# Altium footprint library My_Intlib.PcbLib: 224 footprints (part 14 of 14)
Each footprint in its own frame and in the unit in brackets; x right, y up, seen from the top. Pads: shape width x height; smd on the part's side, far side on the other; paste and mask are expansions set on the pad; w line width, h text height; cw(c..) or ccw(c..) is an arc to the next point about the centre after c.
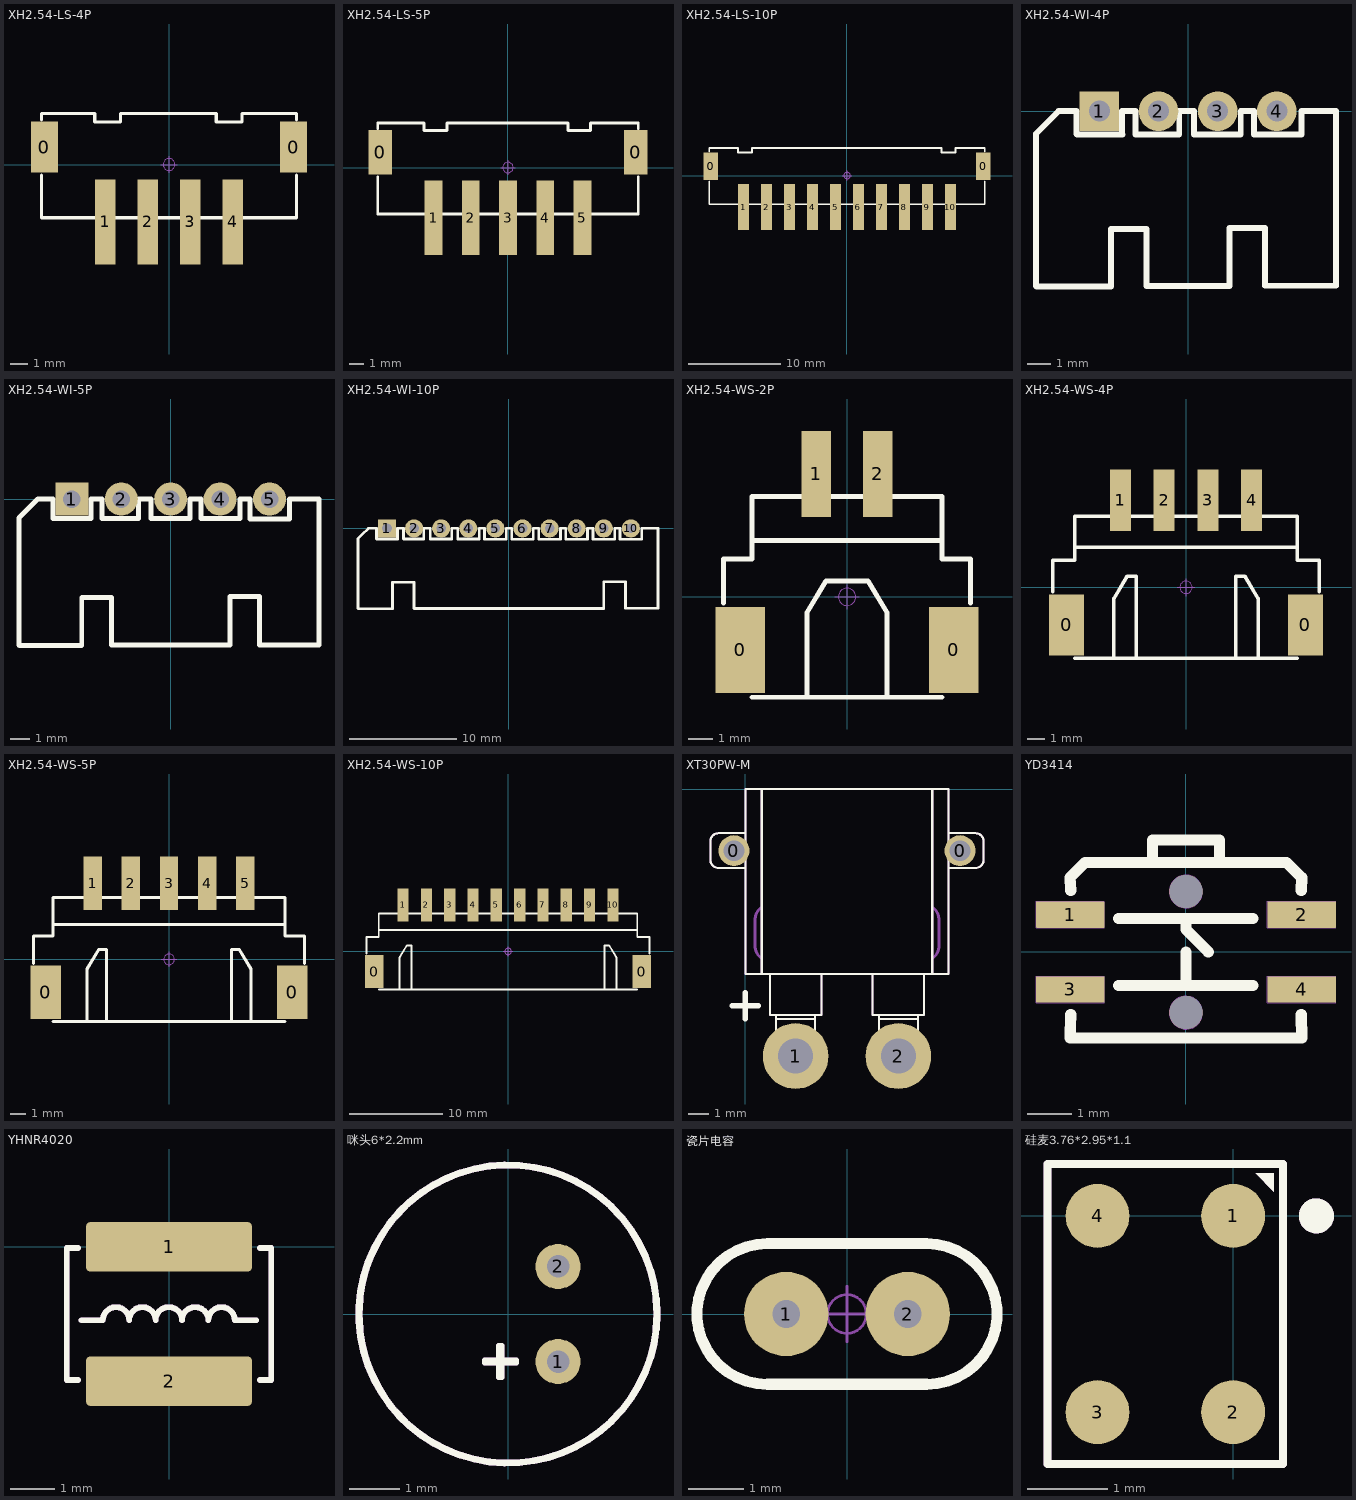
[diagram p13: the footprints below, top view; thin cyan lines are the x and y axes]

## XH2.54-LS-4P [mm] "长：15mm，宽：6mm，高：8.3mm"
pads (6):
  rect 1.6x3 smd: 0(-7.326,1.016) 0(7.326,1.016)
  rect 1.2x5 smd: 1(-3.75,-3.383) 2(-1.25,-3.383) 3(1.25,-3.383) 4(3.75,-3.383)
Top Overlay:
  lines w0.2: -7.5,-0.625 -7.5,-3.125 7.5,-3.125 ; -7.5,2.625 -7.5,3 -4.378,3 -4.378,2.5 -2.854,2.5 -2.854,3 2.774,3 2.774,2.5 4.298,2.5 4.298,3 7.5,3 7.5,2.625 ; 7.5,-3.125 7.5,-0.625
Mechanical 15:
  circle w0.05: c0,0 r0.35
  lines w0.05: -0.5,0 0.5,0 ; 0,-0.5 0,0.5
3D body "XH2.54-LS-4P.STEP": height 8, standoff 0, extent -7.5,-6 7.5,3

## XH2.54-LS-5P [mm] "长：17.5mm，宽：6mm，高：8.3mm"
pads (7):
  rect 1.6x3 smd: 0(-8.576,1.016) 0(8.576,1.016)
  rect 1.2x5 smd: 1(-5,-3.383) 2(-2.5,-3.383) 3(0,-3.383) 4(2.5,-3.383) 5(5,-3.383)
Top Overlay:
  lines w0.2: -8.75,-0.625 -8.75,-3.125 8.75,-3.125 8.75,-0.625 ; -8.75,2.625 -8.75,3 -5.628,3 -5.628,2.5 -4.104,2.5 -4.104,3 4.024,3 4.024,2.5 5.548,2.5 5.548,3 8.75,3 8.75,2.625
Mechanical 15:
  circle w0.05: c0,0 r0.35
  lines w0.05: -0.5,0 0.5,0 ; 0,-0.5 0,0.5
3D body "XH2.54-LS-5P.STEP": height 8, standoff 0, extent -8.75,-6 8.75,3

## XH2.54-LS-10P [mm] "长：30mm，宽：6mm，高：8.3mm"
pads (12):
  rect 1.6x3 smd: 0(-14.826,1.016) 0(14.826,1.016)
  rect 1.2x5 smd: 1(-11.25,-3.433) 2(-8.75,-3.433) 3(-6.25,-3.433) 4(-3.75,-3.433) 5(-1.25,-3.433) 6(1.25,-3.433) 7(3.75,-3.433) 8(6.25,-3.433) 9(8.75,-3.433) 10(11.25,-3.433)
Top Overlay:
  lines w0.2: -15,-0.625 -15,-3.125 15,-3.125 15,-0.625 ; -15,2.625 -15,3 -11.878,3 -11.878,2.5 -10.354,2.5 -10.354,3 10.274,3 10.274,2.5 11.798,2.5 11.798,3 15,3 15,2.625
Mechanical 15:
  circle w0.05: c0,0 r0.35
  lines w0.05: -0.5,0 0.5,0 ; 0,-0.5 0,0.5
3D body "XH2.54-LS-10P.STEP": height 8, standoff 0, extent -15,-6 15,3

## XH2.54-WI-4P [mm] "接插件，4P"
pads (4):
  rect 1.7x1.7 hole 0.9: 1(-3.81,0)
  round 1.7 hole 0.9: 2(-1.27,0) 3(1.27,0) 4(3.81,0)
Top Overlay:
  lines w0.254: -0.376,0 -0.376,-0.988 -0.39,-1.002 -2.256,-1.002 -2.256,0 -2.828,0 -2.828,-0.982 -2.814,-0.996 -4.77,-0.996 -4.784,-0.982 -4.784,0 -5.56,0 -6.142,-0.582 -6.526,-0.966 -6.526,-7.502 -6.5,-7.528 -3.302,-7.528 -3.302,-5.058 -1.778,-5.058 -1.778,-7.502 1.778,-7.502 1.778,-5.006 3.302,-5.006 3.302,-7.49 6.35,-7.49 6.35,0 4.916,0 ; -0.364,0 0.234,0 ; 0.248,-0.996 0.248,0 ; 0.268,-0.996 2.256,-0.996 2.262,-0.99 2.262,0 2.808,0 ; 2.822,0 2.822,-1.002 4.876,-1.002 ; 4.876,-0.976 4.876,0
3D body "XH2.54-4P_H.STEP": height 5.73, standoff -3.37, extent -6.31,-7.35 6.31,0.35

## XH2.54-WI-5P [mm] "接插件，5P"
pads (5):
  rect 1.7x1.7 hole 0.9: 1(-5.08,0)
  round 1.7 hole 0.9: 2(-2.54,0) 3(0,0) 4(2.54,0) 5(5.08,0)
Top Overlay:
  lines w0.254: -1.646,0 -1.646,-0.988 -1.66,-1.002 -3.526,-1.002 -3.526,0 -4.098,0 -4.098,-0.982 -4.084,-0.996 -6.04,-0.996 -6.054,-0.982 -6.054,0 -6.83,0 -7.412,-0.582 -7.796,-0.966 -7.796,-7.502 -7.77,-7.528 -4.572,-7.528 -4.572,-5.058 -3.048,-5.058 -3.048,-7.502 3.048,-7.502 3.048,-5.006 4.572,-5.006 4.572,-7.49 7.62,-7.49 7.62,0 6.096,0 6.096,-1.016 4.064,-1.016 4.064,0 3.556,0 3.556,-1.002 1.552,-1.002 1.552,0 ; -1.634,0 -1.036,0 ; -1.022,-0.996 -1.022,0 ; -1.002,-0.996 0.986,-0.996 0.992,-0.99 0.992,0 1.538,0
3D body "XH2.54-5P_H.STEP": height 5.73, standoff -3.37, extent -7.58,-7.35 7.58,0.35

## XH2.54-WI-10P [mm] "接插件，10P"
pads (10):
  rect 1.7x1.7 hole 0.9: 1(-11.43,0)
  round 1.7 hole 0.9: 2(-8.89,0) 3(-6.35,0) 4(-3.81,0) 5(-1.27,0) 6(1.27,0) 7(3.81,0) 8(6.35,0) 9(8.89,0) 10(11.43,0)
Top Overlay:
  lines w0.254: -7.996,0 -7.996,-0.988 -8.01,-1.002 -9.876,-1.002 -9.876,0 -10.448,0 -10.448,-0.982 -10.434,-0.996 -12.39,-0.996 -12.404,-0.982 -12.404,0 -13.18,0 -13.762,-0.582 -14.146,-0.966 -14.146,-7.502 -14.12,-7.528 -10.922,-7.528 -10.922,-5.058 -8.89,-5.058 -8.89,-7.502 8.89,-7.502 8.89,-5.006 10.922,-5.006 10.922,-7.49 13.97,-7.49 13.97,0 12.446,0 12.446,-1.016 10.414,-1.016 10.414,0 9.906,0 9.906,-1.016 7.874,-1.016 7.874,0 7.366,0 7.366,-1.016 5.334,-1.016 5.334,0 4.826,0 4.826,-1.016 2.794,-1.016 2.794,0 2.286,0 2.286,-1.016 0.254,-1.016 0.254,0 -0.254,0 -0.254,-1.016 -2.286,-1.016 -2.286,0 -2.794,0 -2.794,-1.002 -4.798,-1.002 -4.798,0 ; -7.984,0 -7.386,0 ; -7.372,-0.996 -7.372,0 ; -7.352,-0.996 -5.364,-0.996 -5.358,-0.99 -5.358,0 -4.812,0
3D body "XH2.54-10P_H.STEP": height 5.73, standoff -3.37, extent -13.93,-7.35 13.93,0.35

## XH2.54-WS-2P [mm] "长：10mm，宽：8mm，高：6.1mm"
pads (4):
  rect 2x3.5 smd: 0(-4.327,-2.15) 0(4.327,-2.15)
  rect 1.2x3.5 smd: 1(-1.25,4.981) 2(1.25,4.981)
Top Overlay:
  lines w0.2: -5,-0.254 -5,1.536 -3.85,1.536 -3.85,4.064 3.85,4.064 3.85,1.536 5,1.536 5,-0.254 ; -3.85,-4.064 3.85,-4.064 ; -3.85,2.286 3.85,2.286 ; -1.62,-4.064 -1.62,-0.634 -0.858,0.636 -0.35,0.636 0.858,0.636 1.62,-0.634 1.62,-4.064
Mechanical 15:
  circle w0.05: c0,0 r0.35
  lines w0.05: -0.5,0 0.5,0 ; 0,-0.5 0,0.5
3D body "XH2.54-WS-2P.STEP": height 6.05, standoff -0.01, extent -5,-4 5,6.418

## XH2.54-WS-4P [mm] "长：15mm，宽：8mm，高：6.1mm"
pads (6):
  rect 2x3.5 smd: 0(-6.827,-2.15) 0(6.827,-2.15)
  rect 1.2x3.5 smd: 1(-3.75,4.981) 2(-1.25,4.981) 3(1.25,4.981) 4(3.75,4.981)
Top Overlay:
  lines w0.2: -7.62,-0.254 -7.62,1.536 -6.35,1.536 -6.35,4.064 6.35,4.064 6.35,1.536 7.62,1.536 7.62,-0.254 ; -6.35,-4.064 6.35,-4.064 ; -6.35,2.286 6.35,2.286 ; -4.12,-4.064 -4.12,-0.634 -3.358,0.636 -2.85,0.636 -2.85,-4.064 ; 2.85,-4.064 2.85,0.636 3.358,0.636 4.12,-0.634 4.12,-4.064
Mechanical 15:
  circle w0.05: c0,0 r0.35
  lines w0.05: -0.5,0 0.5,0 ; 0,-0.5 0,0.5
3D body "XH2.54-WS-4P.STEP": height 6.05, standoff -0.01, extent -7.5,-4 7.5,6.418

## XH2.54-WS-5P [mm] "长：17.5mm，宽：8mm，高：6.1mm"
pads (7):
  rect 2x3.5 smd: 0(-8.077,-2.15) 0(8.077,-2.15)
  rect 1.2x3.5 smd: 1(-5,4.981) 2(-2.5,4.981) 3(0,4.981) 4(2.5,4.981) 5(5,4.981)
Top Overlay:
  lines w0.2: -8.89,-0.254 -8.89,1.536 -7.6,1.536 -7.6,4.064 7.6,4.064 7.6,1.536 8.89,1.536 8.89,-0.254 ; -7.6,-4.064 7.6,-4.064 ; -7.6,2.286 7.6,2.286 ; -5.37,-4.064 -5.37,-0.634 -4.608,0.636 -4.1,0.636 -4.1,-4.064 ; 4.1,-4.064 4.1,0.636 4.608,0.636 5.37,-0.634 5.37,-4.064
Mechanical 15:
  circle w0.05: c0,0 r0.35
  lines w0.05: -0.5,0 0.5,0 ; 0,-0.5 0,0.5
3D body "XH2.54-WS-5P.STEP": height 6.05, standoff -0.01, extent -8.75,-4 8.75,6.418

## XH2.54-WS-10P [mm] "长：30mm，宽：8mm，高：6.1mm"
pads (12):
  rect 2x3.5 smd: 0(-14.327,-2.15) 0(14.327,-2.15)
  rect 1.2x3.5 smd: 1(-11.25,4.981) 2(-8.75,4.981) 3(-6.25,4.981) 4(-3.75,4.981) 5(-1.25,4.981) 6(1.25,4.981) 7(3.75,4.981) 8(6.25,4.981) 9(8.75,4.981) 10(11.25,4.981)
Top Overlay:
  lines w0.2: -15.16,-0.254 -15.16,1.536 -13.85,1.536 -13.85,4.064 13.85,4.064 13.85,1.536 15.16,1.536 15.16,-0.254 ; -13.85,-4.064 13.85,-4.064 ; -13.85,2.286 13.85,2.286 ; -11.62,-4.064 -11.62,-0.634 -10.858,0.636 -10.35,0.636 -10.35,-4.064 ; 10.35,-4.064 10.35,0.636 10.858,0.636 11.62,-0.634 11.62,-4.064
Mechanical 15:
  circle w0.05: c0,0 r0.35
  lines w0.05: -0.5,0 0.5,0 ; 0,-0.5 0,0.5
3D body "XH2.54-WS-10P.STEP": height 6.05, standoff -0.01, extent -15,-4 15,6.418

## XT30PW-M [mm] "XT30PW-M公头，15A，航模插头连接器大电流"
pads (4):
  round 1.5 hole 1: 0(-0.55,-3) 0(10.45,-3)
  round 3.2 hole 1.7: 1(2.45,-13) 2(7.45,-13)
Top Overlay:
  circle w0.1: c7.45,-13 r0.85
  circle w0.1: c2.45,-13 r0.85
  lines w0.1: 0,-3.85 -1.3,-3.85 cw(c-1.3,-3.45) -1.7,-3.45 -1.7,-2.55 cw(c-1.3,-2.55) -1.3,-2.15 0,-2.15 ; 0.8,-9 0.8,0 ; 1.2,-9 1.2,-11 3.7,-11 3.7,-9 ; 1.5,-11.2 3.4,-11.2 ; 1.5,-11 1.5,-13 ccw(c2.45,-13) 3.4,-13 3.4,-11 ; 6.2,-9 6.2,-11 8.7,-11 8.7,-9 ; 6.5,-11.2 8.4,-11.2 ; 6.5,-11 6.5,-13 ccw(c7.45,-13) 8.4,-13 8.4,-11 ; 9.1,-9 9.1,0 ; 9.102,-5.741 9.102,-5.741 ; 9.9,-3.85 11.2,-3.85 ccw(c11.2,-3.45) 11.6,-3.45 11.6,-2.55 ccw(c11.2,-2.55) 11.2,-2.15 9.9,-2.15 ; 9.101,-5.74 9.1,-5.739 9.101,-5.74 ; 9.101,-5.74 9.102,-5.741 ; 9.101,-5.74 9.102,-5.741 ; -0.55,-3.5 cw(c-0.55,-3) -0.55,-2.5 cw(c-0.55,-3) -0.55,-3.5 ; 0,-9 9.9,-9 9.9,0 0,0 0,-9 ; 10.45,-3.5 ccw(c10.45,-3) 10.45,-2.5 ccw(c10.45,-3) 10.45,-3.5
  lines w0.254: -0.635,-10.552 0.635,-10.552 ; 0,-11.187 0,-9.917
Top Value:
  text ".Comment" at 2.667,-3.227 h0.89
Top Assembly:
  lines w0.1: 0,-3.85 -1.3,-3.85 cw(c-1.3,-3.45) -1.7,-3.45 -1.7,-2.55 cw(c-1.3,-2.55) -1.3,-2.15 0,-2.15 ; 0.8,-9 0.8,0 ; 1.2,-9 1.2,-11 3.7,-11 3.7,-9 ; 1.5,-11.2 3.4,-11.2 ; 1.5,-11 1.5,-13 ccw(c2.45,-13) 3.4,-13 3.4,-11 ; 6.2,-9 6.2,-11 8.7,-11 8.7,-9 ; 6.5,-11.2 8.4,-11.2 ; 6.5,-11 6.5,-13 ccw(c7.45,-13) 8.4,-13 8.4,-11 ; 9.1,-9 9.1,0 ; 9.9,-3.85 11.2,-3.85 ccw(c11.2,-3.45) 11.6,-3.45 11.6,-2.55 ccw(c11.2,-2.55) 11.2,-2.15 9.9,-2.15 ; 10.45,-3.5 cw(c10.45,-3) 10.45,-2.5 ; 10.45,-3.5 ccw(c10.45,-3) 10.45,-2.5 ; 10.45,-3.5 cw(c10.45,-3) 10.45,-2.5 ; -0.55,-3.5 cw(c-0.55,-3) -0.55,-2.5 cw(c-0.55,-3) -0.55,-3.5 ; 0,-9 0,0 9.9,0 9.9,-9 0,-9
  text ".Designator" at 2.667,-2.434 h0.89
Mechanical 15:
  drawing of 3380 lines, arcs and shapes, not listed
3D body "XT30PW.STEP": height 5, standoff -2, extent -1.7,-13.95 11.6,0

## YD3414 [mm] "中龟按键3.5*4.7*1.6"
pads (6):
  rrect5% 1.55x0.6 smd: 1(-2.628,0.848) 2(2.628,0.848) 3(-2.625,-0.851) 4(2.631,-0.851)
  round 0.75 hole 0.75 unplated mask+0: ""(0,-1.378) ""(0,1.372)
Top Overlay:
  lines w0.254: -2.616,-1.422 -2.628,-1.951 2.628,-1.951 2.616,-1.422 ; -2.616,1.397 -2.628,1.69 -2.286,2.032 2.286,2.032 2.628,1.69 2.616,1.397 ; -1.524,-0.762 1.524,-0.762 ; -1.524,0.762 1.524,0.762 ; -0.762,2.032 -0.762,2.54 0.762,2.54 0.762,2.032 ; 0,-0.762 0,0 ; 0,0.762 0,0.508 0.508,0
Top Value:
  text ".Comment" at -1.524,-3.608 h0.89
Top Assembly:
  text ".Designator" at -1.524,-2.815 h0.89
Mechanical 15:
  circle w0.006: c-2.625,0.847 r0.003
  circle w0.006: c0,-0.003 r0.003
  circle w0.006: c0,-0.003 r0.003
  circle w0.013: c0,-1.378 r0.3
  circle w0.013: c0,1.372 r0.3
  circle w0.013: c0,1.372 r0.375
  circle w0.013: c0,-1.378 r0.375
  lines w0.013: -3.4,0.547 -1.85,1.147 ; -3.4,0.547 -1.85,0.547 ; -3.4,0.547 -3.4,1.147 ; -3.4,1.147 -1.85,0.547 ; -3.4,1.147 -1.85,1.147 ; -1.85,0.547 -1.85,1.147 ; -3.4,-1.153 -3.4,-0.553 -1.85,-0.553 -1.85,-1.153 -3.4,-1.153 ; 1.85,-1.153 1.85,-0.553 3.4,-0.553 3.4,-1.153 1.85,-1.153 ; 1.85,0.547 1.85,1.147 3.4,1.147 3.4,0.547 1.85,0.547
3D body "龟形按键.STEP": height 1.6, standoff -0.61, extent -3.225,-1.805 3.275,2.744

## YHNR4020 [mm]
pads (2):
  rrect15% 3.7x1.1 smd: 1(0,0) 2(0,-3)
Top Overlay:
  lines w0.127: -2.286,-1.651 -2.286,-0.025 -2.032,-0.025 ; -2.286,-1.349 -2.286,-2.975 -2.032,-2.975 ; -1.955,-1.641 -1.478,-1.641 cw(c-1.183,-1.641) -0.888,-1.641 cw(c-0.594,-1.641) -0.299,-1.641 cw(c-0.005,-1.641) 0.29,-1.641 cw(c0.584,-1.641) 0.879,-1.641 cw(c1.174,-1.641) 1.468,-1.641 1.946,-1.641 ; 2.032,-2.975 2.286,-2.975 2.286,-1.349 ; 2.032,-0.025 2.286,-0.025 2.286,-1.651
Top Value:
  text ".Comment" at 3.714,-0.975 h0.89
Top Assembly:
  lines w0.127: -2.286,-1.651 -2.286,-0.025 -2.032,-0.025 ; -2.286,-1.349 -2.286,-2.975 -2.032,-2.975 ; -1.955,-1.641 -1.478,-1.641 cw(c-1.183,-1.641) -0.888,-1.641 cw(c-0.594,-1.641) -0.299,-1.641 cw(c-0.005,-1.641) 0.29,-1.641 cw(c0.584,-1.641) 0.879,-1.641 cw(c1.174,-1.641) 1.468,-1.641 1.946,-1.641 ; 2.032,-2.975 2.286,-2.975 2.286,-1.349 ; 2.032,-0.025 2.286,-0.025 2.286,-1.651
  text ".Designator" at 3.638,-0.061 h0.89
3D body "YHNR4020.STEP": height 2, standoff -0.01, extent -2,-3.499 2,0.501

## 咪头6*2.2mm [mm] "驻极体咪头，直径6mm*厚度2.2mm，灵敏度-48~66dB，频响范围50~20KHz，全指向，最大500uA，额定3V，工作范围1.5~10V"
pads (2):
  round 0.9 hole 0.45: 1(1,-0.95) 2(1,0.95)
Top Overlay:
  circle w0.1: c0,0 r2.96
  circle w0.1: c0,0 r3
  lines w0.1: -0.471,-0.983 -0.471,-0.917 -0.186,-0.917 -0.186,-0.631 -0.119,-0.631 -0.119,-0.917 0.167,-0.917 0.167,-0.983 -0.119,-0.983 -0.119,-1.269 -0.186,-1.269 -0.186,-0.983 -0.471,-0.983
Top Value:
  text ".Comment" at 3.175,-0.23 h0.89
Top Assembly:
  text ".Designator" at 3.175,0.564 h0.89
Mechanical 15:
  circle w0.1: c0,0 r2.96
  circle w0.1: c0,0 r3
  lines w0.1: -0.471,-0.983 -0.471,-0.917 -0.186,-0.917 -0.186,-0.631 -0.119,-0.631 -0.119,-0.917 0.167,-0.917 0.167,-0.983 -0.119,-0.983 -0.119,-1.269 -0.186,-1.269 -0.186,-0.983 -0.471,-0.983
3D body "咪头.STEP": height 2.3, standoff -2.8, extent -3,-3 3,3

## 瓷片电容 [mm] "脚距2.2mm直径5mm"
height 6.35
pads (2):
  round 1.524 hole 0.5: 1(-1.1,0) 2(1.1,0)
Top Overlay:
  lines w0.2: -1.44,-1.271 cw(c-1.44,0) -1.44,1.271 1.44,1.271 cw(c1.44,0) 1.44,-1.271 -1.44,-1.269
Mechanical 15:
  circle w0.05: c0,0 r0.35
  lines w0.05: -0.5,0 0.5,0 ; 0,-0.5 0,0.5
3D body "CC 2.2X5.STEP": height 4.8, standoff -3.5, extent -2.4,-0.917 2.4,0.918

## 硅麦3.76*2.95*1.1 [mm] "模拟硅麦，尺寸3.76mm*2.95mm*1.1mm"
pads (4):
  round 0.8 smd: 1(0,0) 2(0,-2.46) 3(-1.7,-2.46) 4(-1.7,0)
Top Overlay:
  circle w0.24: c1.043,0 r0.1
  region: 0.282,0.533 0.51,0.305 0.51,0.533
  lines w0.1: -2.325,-3.11 -1.7,-3.11 0,-3.11 0.625,-3.11 0.625,0.65 0,0.65 -1.7,0.65 -2.325,0.65 -2.325,-3.11
Top Value:
  text ".Comment" at 1.371,-0.717 h0.89
Top Assembly:
  circle w0.24: c1.043,0 r0.1
  region: 0.282,0.533 0.51,0.305 0.51,0.533
  lines w0.1: -2.325,-3.11 -1.7,-3.11 0,-3.11 0.625,-3.11 0.625,0.65 0,0.65 -1.7,0.65 -2.325,0.65 -2.325,-3.11
  text ".Designator" at 1.371,0.077 h0.89
3D body "3927麦克风.STEP": height 1.13, standoff 0, extent -2.332,-3.11 0.618,0.65